# Altium footprint library 6-Connectors-1.PcbLib: 54 footprints (part 1 of 5) (continued)
## AMPHENOL_L717DFB25P1ATN [mm] "Right Angled D-Sub 25 Male Contacts with Metal Bracket and Front Female Screwlock (UNC4-40)" (continued)
3D body "v160-080.stp": height 0.02, standoff -1.65, extent -6.34,-2.07 -4.74,-0.47
3D body "v160-080.stp": height 0.02, standoff -1.65, extent -7.71,0.47 -6.11,2.07
3D body "v160-080.stp": height 0.02, standoff -1.65, extent -9.11,-2.07 -7.51,-0.47
3D body "v160-080.stp": height 0.02, standoff -1.65, extent -10.48,0.47 -8.88,2.07
3D body "v160-080.stp": height 0.02, standoff -1.65, extent -11.88,-2.07 -10.28,-0.47
3D body "v160-080.stp": height 0.02, standoff -1.65, extent -14.65,-2.07 -13.05,-0.47
3D body "v160-080.stp": height 0.02, standoff -1.65, extent -13.25,0.47 -11.65,2.07
3D body "v160-080.stp": height 0.02, standoff -1.65, extent -16.02,0.47 -14.42,2.07
3D body "v160-080.stp": height 0.02, standoff -1.65, extent -17.42,-2.07 -15.82,-0.47
3D body "AMPHENOL_L717DFA25P1ATN.stp": height 13.45, standoff -3.95, extent -26.6,-2.93 26.6,17.47

## AMPHENOL_L717DFC37P1ATN [mm] "Right Angled D-Sub 37 Male Contacts with Metal Bracket and Front Female Screwlock (UNC4-40)"
height 13.4
pads (39):
  round 1.6 hole 0.9: 1(24.93,-1.27) 2(22.16,-1.27) 3(19.39,-1.27) 4(16.62,-1.27) 5(13.85,-1.27) 6(11.08,-1.27) 7(8.31,-1.27) 8(5.54,-1.27) 9(2.77,-1.27) 10(0,-1.27) 11(-2.77,-1.27) 12(-5.54,-1.27) 13(-8.31,-1.27) 14(-11.08,-1.27) 15(-13.85,-1.27) 16(-16.62,-1.27) 17(-19.39,-1.27) 18(-22.16,-1.27) 19(-24.93,-1.27) 20(23.56,1.27) 21(20.79,1.27) 22(18.02,1.27) 23(15.25,1.27) 24(12.48,1.27) 25(9.71,1.27) 26(6.94,1.27) 27(4.17,1.27) 28(1.4,1.27) 29(-1.37,1.27) 30(-4.14,1.27) 31(-6.91,1.27) 32(-9.68,1.27) 33(-12.45,1.27) 34(-15.22,1.27) 35(-17.99,1.27) 36(-20.76,1.27) 37(-23.53,1.27)
  round 5.5 hole 3.2: 38(31.75,0) 39(-31.75,0)
Top Overlay:
  circle w0.2: c31.75,5.2 r0.8
  circle w0.2: c-31.75,5.2 r0.8
  lines w0.2: -34.6,10.67 -34.6,11.57 34.6,11.57 34.6,10.67 ; -34.25,9.67 -34.25,9.17 -29.25,9.17 -29.25,9.67 ; -34.25,11.57 -34.25,16.77 -29.25,16.77 -29.25,11.57 ; -32.907,-2.93 -34.85,-2.93 -34.85,10.67 34.85,10.67 34.85,-2.93 32.907,-2.93 ; -30.593,-2.93 -28.65,-2.93 -28.65,10.67 ; -28.789,9.67 -34.85,9.67 -28.65,9.67 ; -28.65,7.17 28.65,7.17 ; -28.001,11.57 -28.001,17.17 cw(c-27.701,17.17) -27.701,17.47 27.702,17.47 cw(c27.702,17.17) 28.002,17.17 28.002,11.57 ; -26.82,7.17 -26.82,6.17 26.82,6.17 26.82,7.17 ; 28.65,9.67 34.85,9.67 ; 28.65,10.67 28.65,-2.93 30.593,-2.93 ; 29.25,9.67 29.25,9.17 34.25,9.17 34.25,9.67 ; 29.25,11.57 29.25,16.77 34.25,16.77 34.25,11.57
  text "37" at -27.197,0.508 h1.2
  text "19" at -28.21,-2 h1.2
  text "1" at 26.181,-2.032 h1.2
  text "20" at 26.181,0.508 h1.2
Mechanical 8:
  drawing of 164 lines, arcs and shapes, not listed
Mechanical 14:
  circle w0.1: c31.75,0 r1.6
  circle w0.1: c31.75,5.2 r0.8
  circle w0.1: c-31.75,5.2 r0.8
  circle w0.1: c-31.75,0 r1.6
  lines w0.1: -34.6,10.67 -34.6,11.57 34.6,11.57 34.6,10.67 ; -34.25,9.67 -34.25,9.17 -29.25,9.17 -29.25,9.67 ; -34.25,11.57 -34.25,16.77 -29.25,16.77 -29.25,11.57 ; -28.789,9.67 -34.85,9.67 -28.65,9.67 ; -28.65,7.17 28.65,7.17 ; -28.65,10.67 -28.65,-2.93 -34.85,-2.93 -34.85,10.67 34.85,10.67 34.85,-2.93 28.65,-2.93 28.65,10.67 ; -28.001,11.57 -28.001,17.17 cw(c-27.701,17.17) -27.701,17.47 27.702,17.47 cw(c27.702,17.17) 28.002,17.17 28.002,11.57 ; -26.82,7.17 -26.82,6.17 26.82,6.17 26.82,7.17 ; -25.33,6.17 -25.33,-1.27 ccw(c-24.93,-1.27) -24.53,-1.27 -24.53,6.17 ; -23.93,6.17 -23.93,1.27 ccw(c-23.53,1.27) -23.13,1.27 -23.13,6.17 ; -22.56,6.17 -22.56,-1.27 ccw(c-22.16,-1.27) -21.76,-1.27 -21.76,6.17 ; -21.16,6.17 -21.16,1.27 ccw(c-20.76,1.27) -20.36,1.27 -20.36,6.17 ; -19.79,6.17 -19.79,-1.27 ccw(c-19.39,-1.27) -18.99,-1.27 -18.99,6.17 ; -18.39,6.17 -18.39,1.27 ccw(c-17.99,1.27) -17.59,1.27 -17.59,6.17 ; -17.02,6.17 -17.02,-1.27 ccw(c-16.62,-1.27) -16.22,-1.27 -16.22,6.17 ; -15.62,6.17 -15.62,1.27 ccw(c-15.22,1.27) -14.82,1.27 -14.82,6.17 ; -14.25,6.17 -14.25,-1.27 ccw(c-13.85,-1.27) -13.45,-1.27 -13.45,6.17 ; -12.85,6.17 -12.85,1.27 ccw(c-12.45,1.27) -12.05,1.27 -12.05,6.17 ; -11.48,6.17 -11.48,-1.27 ccw(c-11.08,-1.27) -10.68,-1.27 -10.68,6.17 ; -10.08,6.17 -10.08,1.27 ccw(c-9.68,1.27) -9.28,1.27 -9.28,6.17 ; -8.71,6.17 -8.71,-1.27 ccw(c-8.31,-1.27) -7.91,-1.27 -7.91,6.17 ; -7.31,6.17 -7.31,1.27 ccw(c-6.91,1.27) -6.51,1.27 -6.51,6.17 ; -5.94,6.17 -5.94,-1.27 ccw(c-5.54,-1.27) -5.14,-1.27 -5.14,6.17 ; -4.54,6.17 -4.54,1.27 ccw(c-4.14,1.27) -3.74,1.27 -3.74,6.17 ; -3.17,6.17 -3.17,-1.27 ccw(c-2.77,-1.27) -2.37,-1.27 -2.37,6.17 ; -1.77,6.17 -1.77,1.27 ccw(c-1.37,1.27) -0.97,1.27 -0.97,6.17 ; -0.4,6.17 -0.4,-1.27 ccw(c0,-1.27) 0.4,-1.27 0.4,6.17 ; 1,6.17 1,1.27 ccw(c1.4,1.27) 1.8,1.27 1.8,6.17 ; 2.37,6.17 2.37,-1.27 ccw(c2.77,-1.27) 3.17,-1.27 3.17,6.17 ; 3.77,6.17 3.77,1.27 ccw(c4.17,1.27) 4.57,1.27 4.57,6.17 ; 5.14,6.17 5.14,-1.27 ccw(c5.54,-1.27) 5.94,-1.27 5.94,6.17 ; 6.54,6.17 6.54,1.27 ccw(c6.94,1.27) 7.34,1.27 7.34,6.17 ; 7.91,6.17 7.91,-1.27 ccw(c8.31,-1.27) 8.71,-1.27 8.71,6.17 ; 9.31,6.17 9.31,1.27 ccw(c9.71,1.27) 10.11,1.27 10.11,6.17 ; 10.68,6.17 10.68,-1.27 ccw(c11.08,-1.27) 11.48,-1.27 11.48,6.17 ; 12.08,6.17 12.08,1.27 ccw(c12.48,1.27) 12.88,1.27 12.88,6.17 ; 13.45,6.17 13.45,-1.27 ccw(c13.85,-1.27) 14.25,-1.27 14.25,6.17 ; 14.85,6.17 14.85,1.27 ccw(c15.25,1.27) 15.65,1.27 15.65,6.17 ; 16.22,6.17 16.22,-1.27 ccw(c16.62,-1.27) 17.02,-1.27 17.02,6.17 ; 17.62,6.17 17.62,1.27 ccw(c18.02,1.27) 18.42,1.27 18.42,6.17 ; 18.99,6.17 18.99,-1.27 ccw(c19.39,-1.27) 19.79,-1.27 19.79,6.17 ; 20.39,6.17 20.39,1.27 ccw(c20.79,1.27) 21.19,1.27 21.19,6.17 ; 21.76,6.17 21.76,-1.27 ccw(c22.16,-1.27) 22.56,-1.27 22.56,6.17 ; 23.16,6.17 23.16,1.27 ccw(c23.56,1.27) 23.96,1.27 23.96,6.17 ; 24.53,6.17 24.53,-1.27 ccw(c24.93,-1.27) 25.33,-1.27 25.33,6.17 ; 28.65,9.67 34.85,9.67 ; 29.25,9.67 29.25,9.17 34.25,9.17 34.25,9.67 ; 29.25,11.57 29.25,16.77 34.25,16.77 34.25,11.57
3D body "AMPHENOL_L717DFC37P1ATN.stp": height 13.45, standoff -3.95, extent -34.85,-2.93 34.85,17.47
3D body "v160-080.stp": height 0.02, standoff -1.65, extent -25.73,-2.07 -24.13,-0.47
3D body "v160-080.stp": height 0.02, standoff -1.65, extent -24.33,0.47 -22.73,2.07
3D body "v160-080.stp": height 0.02, standoff -1.65, extent -22.96,-2.07 -21.36,-0.47
3D body "v160-080.stp": height 0.02, standoff -1.65, extent -21.56,0.47 -19.96,2.07
3D body "v160-080.stp": height 0.02, standoff -1.65, extent -20.19,-2.07 -18.59,-0.47
3D body "v160-080.stp": height 0.02, standoff -1.65, extent -18.79,0.47 -17.19,2.07
3D body "v160-080.stp": height 0.02, standoff -1.65, extent -16.02,0.47 -14.42,2.07
3D body "v160-080.stp": height 0.02, standoff -1.65, extent -17.42,-2.07 -15.82,-0.47
3D body "v160-080.stp": height 0.02, standoff -1.65, extent -14.65,-2.07 -13.05,-0.47
3D body "v160-080.stp": height 0.02, standoff -1.65, extent -13.25,0.47 -11.65,2.07
3D body "v160-080.stp": height 0.02, standoff -1.65, extent -10.48,0.47 -8.88,2.07
3D body "v160-080.stp": height 0.02, standoff -1.65, extent -11.88,-2.07 -10.28,-0.47
3D body "v160-080.stp": height 0.02, standoff -1.65, extent -9.11,-2.07 -7.51,-0.47
3D body "v160-080.stp": height 0.02, standoff -1.65, extent -6.34,-2.07 -4.74,-0.47
3D body "v160-080.stp": height 0.02, standoff -1.65, extent -7.658,0.47 -6.058,2.07
3D body "v160-080.stp": height 0.02, standoff -1.65, extent -4.94,0.47 -3.34,2.07
3D body "v160-080.stp": height 0.02, standoff -1.65, extent -3.57,-2.07 -1.97,-0.47
3D body "v160-080.stp": height 0.02, standoff -1.65, extent -0.8,-2.07 0.8,-0.47
3D body "v160-080.stp": height 0.02, standoff -1.65, extent -2.17,0.47 -0.57,2.07
3D body "v160-080.stp": height 0.02, standoff -1.65, extent 0.6,0.47 2.2,2.07
3D body "v160-080.stp": height 0.02, standoff -1.65, extent 1.97,-2.07 3.57,-0.47
3D body "v160-080.stp": height 0.02, standoff -1.65, extent 4.74,-2.07 6.34,-0.47
3D body "v160-080.stp": height 0.02, standoff -1.65, extent 3.37,0.47 4.97,2.07
3D body "v160-080.stp": height 0.02, standoff -1.65, extent 6.14,0.47 7.74,2.07
3D body "v160-080.stp": height 0.02, standoff -1.65, extent 7.51,-2.07 9.11,-0.47
3D body "v160-080.stp": height 0.02, standoff -1.65, extent 8.91,0.47 10.51,2.07
3D body "v160-080.stp": height 0.02, standoff -1.65, extent 10.28,-2.07 11.88,-0.47
3D body "v160-080.stp": height 0.02, standoff -1.65, extent 11.646,0.47 13.246,2.07
3D body "v160-080.stp": height 0.02, standoff -1.65, extent 13.05,-2.07 14.65,-0.47
3D body "v160-080.stp": height 0.02, standoff -1.65, extent 14.45,0.47 16.05,2.07
3D body "v160-080.stp": height 0.02, standoff -1.65, extent 15.82,-2.07 17.42,-0.47
3D body "v160-080.stp": height 0.02, standoff -1.65, extent 17.22,0.47 18.82,2.07
3D body "v160-080.stp": height 0.02, standoff -1.65, extent 18.59,-2.07 20.19,-0.47
3D body "v160-080.stp": height 0.02, standoff -1.65, extent 21.36,-2.07 22.96,-0.47
3D body "v160-080.stp": height 0.02, standoff -1.65, extent 19.99,0.47 21.59,2.07
3D body "v160-080.stp": height 0.02, standoff -1.65, extent 22.76,0.47 24.36,2.07
3D body "v160-080.stp": height 0.02, standoff -1.65, extent 24.13,-2.07 25.73,-0.47

## AMPHENOL_L717DFE09P1ATN [mm] "Right Angled D-Sub 9 Male Contacts with Metal Bracket and Front Female Screwlock (UNC4-40)"
height 13.4
pads (11):
  round 1.6 hole 0.9: 1(5.48,-1.27) 2(2.74,-1.27) 3(0,-1.27) 4(-2.74,-1.27) 5(-5.48,-1.27) 6(4.11,1.27) 7(1.37,1.27) 8(-1.37,1.27) 9(-4.11,1.27)
  round 5.5 hole 3.2: 10(-12.495,0) 11(12.495,0)
Top Overlay:
  circle w0.2: c-12.5,5.2 r0.8
  circle w0.2: c12.5,5.2 r0.8
  lines w0.2: -15.35,10.67 -15.35,11.57 15.35,11.57 15.35,10.67 ; -15,9.67 -15,9.17 -10,9.17 -10,9.67 ; -15,11.57 -15,16.77 -10,16.77 -10,11.57 ; -14,-2.93 -15.6,-2.93 -15.6,10.67 15.6,10.67 15.6,-2.93 14,-2.93 ; -11,-2.93 -9.4,-2.93 -9.4,10.67 ; -9.539,9.67 -15.6,9.67 -9.4,9.67 ; -9.4,7.17 9.4,7.17 ; -8.142,11.57 -8.142,17.37 cw(c-7.842,17.37) -7.842,17.67 7.861,17.67 cw(c7.861,17.37) 8.161,17.37 8.161,11.57 ; -7.57,7.17 -7.57,6.17 7.57,6.17 7.57,7.17 ; 9.4,9.67 15.6,9.67 ; 9.4,10.67 9.4,-2.93 11,-2.93 ; 10,9.67 10,9.17 15,9.17 15,9.67 ; 10,11.57 10,16.77 15,16.77 15,11.57
  text "9" at -7.747,0.508 h1.5
  text "1" at 6.731,-2.032 h1.5
  text "5" at -7.747,-2.032 h1.5
  text "6" at 6.604,0.635 h1.5
Mechanical 8:
  lines w0.1: -13.5,0 -12.5,0 ; -12.5,-1 -12.5,0 ; -12.5,1 -12.5,0 ; -11.5,0 -12.5,0 ; -6.48,-1.27 -5.48,-1.27 ; -5.48,-2.27 -5.48,-1.27 ; -5.48,-0.27 -5.48,-1.27 ; -5.11,1.27 -4.11,1.27 ; -4.48,-1.27 -5.48,-1.27 ; -4.11,0.27 -4.11,1.27 ; -4.11,2.27 -4.11,1.27 ; -3.74,-1.27 -2.74,-1.27 ; -3.11,1.27 -4.11,1.27 ; -2.74,-2.27 -2.74,-1.27 ; -2.74,-0.27 -2.74,-1.27 ; -2.37,1.27 -1.37,1.27 ; -1.74,-1.27 -2.74,-1.27 ; -1.37,0.27 -1.37,1.27 ; -1.37,2.27 -1.37,1.27 ; -1,-1.27 0,-1.27 ; -1,0 0,0 ; -0.37,1.27 -1.37,1.27 ; 0,-2.27 0,-1.27 ; 0,-1 0,0 ; 0,-0.27 0,-1.27 ; 0,1 0,0 ; 0.37,1.27 1.37,1.27 ; 1,-1.27 0,-1.27 ; 1,0 0,0 ; 1.37,0.27 1.37,1.27 ; 1.37,2.27 1.37,1.27 ; 1.74,-1.27 2.74,-1.27 ; 2.37,1.27 1.37,1.27 ; 2.74,-2.27 2.74,-1.27 ; 2.74,-0.27 2.74,-1.27 ; 3.11,1.27 4.11,1.27 ; 3.74,-1.27 2.74,-1.27 ; 4.11,0.27 4.11,1.27 ; 4.11,2.27 4.11,1.27 ; 4.48,-1.27 5.48,-1.27 ; 5.11,1.27 4.11,1.27 ; 5.48,-2.27 5.48,-1.27 ; 5.48,-0.27 5.48,-1.27 ; 6.48,-1.27 5.48,-1.27 ; 11.5,0 12.5,0 ; 12.5,-1 12.5,0 ; 12.5,1 12.5,0 ; 13.5,0 12.5,0
Mechanical 14:
  circle w0.1: c-12.5,0 r1.6
  circle w0.1: c-12.5,5.2 r0.8
  circle w0.1: c12.5,5.2 r0.8
  circle w0.1: c12.5,0 r1.6
  lines w0.1: -15.35,10.67 -15.35,11.57 15.35,11.57 15.35,10.67 ; -15,9.67 -15,9.17 -10,9.17 -10,9.67 ; -15,11.57 -15,16.77 -10,16.77 -10,11.57 ; -9.539,9.67 -15.6,9.67 -9.4,9.67 ; -9.4,7.17 9.4,7.17 ; -9.4,10.67 -9.4,-2.93 -15.6,-2.93 -15.6,10.67 15.6,10.67 15.6,-2.93 9.4,-2.93 9.4,10.67 ; -8.142,11.57 -8.142,17.37 cw(c-7.842,17.37) -7.842,17.67 7.861,17.67 cw(c7.861,17.37) 8.161,17.37 8.161,11.57 ; -7.57,7.17 -7.57,6.17 7.57,6.17 7.57,7.17 ; -5.88,6.17 -5.88,-1.27 ccw(c-5.48,-1.27) -5.08,-1.27 -5.08,6.17 ; -4.51,6.17 -4.51,1.27 ccw(c-4.11,1.27) -3.71,1.27 -3.71,6.17 ; -3.14,6.17 -3.14,-1.27 ccw(c-2.74,-1.27) -2.34,-1.27 -2.34,6.17 ; -1.77,6.17 -1.77,1.27 ccw(c-1.37,1.27) -0.97,1.27 -0.97,6.17 ; -0.4,6.17 -0.4,-1.27 ccw(c0,-1.27) 0.4,-1.27 0.4,6.17 ; 0.97,6.17 0.97,1.27 ccw(c1.37,1.27) 1.77,1.27 1.77,6.17 ; 2.34,6.17 2.34,-1.27 ccw(c2.74,-1.27) 3.14,-1.27 3.14,6.17 ; 3.71,6.17 3.71,1.27 ccw(c4.11,1.27) 4.51,1.27 4.51,6.17 ; 5.08,6.17 5.08,-1.27 ccw(c5.48,-1.27) 5.88,-1.27 5.88,6.17 ; 9.4,9.67 15.6,9.67 ; 10,9.67 10,9.17 15,9.17 15,9.67 ; 10,11.57 10,16.77 15,16.77 15,11.57
3D body "v160-080.stp": height 0.02, standoff -1.65, extent 3.31,0.47 4.91,2.07
3D body "v160-080.stp": height 0.02, standoff -1.65, extent 4.68,-2.07 6.28,-0.47
3D body "v160-080.stp": height 0.02, standoff -1.65, extent 1.94,-2.07 3.54,-0.47
3D body "v160-080.stp": height 0.02, standoff -1.65, extent 0.57,0.47 2.17,2.07
3D body "v160-080.stp": height 0.02, standoff -1.65, extent -2.17,0.47 -0.57,2.07
3D body "v160-080.stp": height 0.02, standoff -1.65, extent -0.8,-2.07 0.8,-0.47
3D body "v160-080.stp": height 0.02, standoff -1.65, extent -3.54,-2.07 -1.94,-0.47
3D body "v160-080.stp": height 0.02, standoff -1.65, extent -4.91,0.47 -3.31,2.07
3D body "v160-080.stp": height 0.02, standoff -1.65, extent -6.28,-2.07 -4.68,-0.47
3D body "AMPHENOL_L717DFE09P1ATN.stp": height 13.45, standoff -3.95, extent -15.6,-2.93 15.6,17.67

## AMPHENOL_L717DFE09S1ATN [mm] "Right Angled D-Sub 9 Female Contacts with Metal Bracket and Front Female Screwlock (UNC4-40)"
height 13.4
pads (11):
  round 1.6 hole 0.9: 1(-5.48,-1.27) 2(-2.74,-1.27) 3(0,-1.27) 4(2.74,-1.27) 5(5.48,-1.27) 6(-4.11,1.27) 7(-1.37,1.27) 8(1.37,1.27) 9(4.11,1.27)
  round 5.5 hole 3.2: 10(-12.495,0) 11(12.495,0)
Top Overlay:
  circle w0.2: c-12.5,5.2 r0.8
  circle w0.2: c12.5,5.2 r0.8
  lines w0.2: -15.35,10.67 -15.35,11.57 15.35,11.57 15.35,10.67 ; -15,9.67 -15,9.17 -10,9.17 -10,9.67 ; -15,11.57 -15,16.77 -10,16.77 -10,11.57 ; -14,-2.93 -15.6,-2.93 -15.6,10.67 15.6,10.67 15.6,-2.93 14,-2.93 ; -11,-2.93 -9.4,-2.93 -9.4,10.67 ; -9.539,9.67 -15.6,9.67 -9.4,9.67 ; -9.4,7.17 9.4,7.17 ; -8.142,11.57 -8.142,17.37 cw(c-7.842,17.37) -7.842,17.67 7.861,17.67 cw(c7.861,17.37) 8.161,17.37 8.161,11.57 ; -7.57,7.17 -7.57,6.17 7.57,6.17 7.57,7.17 ; 9.4,9.67 15.6,9.67 ; 9.4,10.67 9.4,-2.93 11,-2.93 ; 10,9.67 10,9.17 15,9.17 15,9.67 ; 10,11.57 10,16.77 15,16.77 15,11.57
  text "6" at -7.366,0.508 h1.5
  text "5" at 6.731,-2.032 h1.5
  text "1" at -7.239,-2.032 h1.5
  text "9" at 6.731,0.508 h1.5
Mechanical 8:
  lines w0.1: -13.5,0 -12.5,0 ; -12.5,-1 -12.5,0 ; -12.5,1 -12.5,0 ; -11.5,0 -12.5,0 ; -6.48,-1.27 -5.48,-1.27 ; -5.48,-2.27 -5.48,-1.27 ; -5.48,-0.27 -5.48,-1.27 ; -5.11,1.27 -4.11,1.27 ; -4.48,-1.27 -5.48,-1.27 ; -4.11,0.27 -4.11,1.27 ; -4.11,2.27 -4.11,1.27 ; -3.74,-1.27 -2.74,-1.27 ; -3.11,1.27 -4.11,1.27 ; -2.74,-2.27 -2.74,-1.27 ; -2.74,-0.27 -2.74,-1.27 ; -2.37,1.27 -1.37,1.27 ; -1.74,-1.27 -2.74,-1.27 ; -1.37,0.27 -1.37,1.27 ; -1.37,2.27 -1.37,1.27 ; -1,-1.27 0,-1.27 ; -1,0 0,0 ; -0.37,1.27 -1.37,1.27 ; 0,-2.27 0,-1.27 ; 0,-1 0,0 ; 0,-0.27 0,-1.27 ; 0,1 0,0 ; 0.37,1.27 1.37,1.27 ; 1,-1.27 0,-1.27 ; 1,0 0,0 ; 1.37,0.27 1.37,1.27 ; 1.37,2.27 1.37,1.27 ; 1.74,-1.27 2.74,-1.27 ; 2.37,1.27 1.37,1.27 ; 2.74,-2.27 2.74,-1.27 ; 2.74,-0.27 2.74,-1.27 ; 3.11,1.27 4.11,1.27 ; 3.74,-1.27 2.74,-1.27 ; 4.11,0.27 4.11,1.27 ; 4.11,2.27 4.11,1.27 ; 4.48,-1.27 5.48,-1.27 ; 5.11,1.27 4.11,1.27 ; 5.48,-2.27 5.48,-1.27 ; 5.48,-0.27 5.48,-1.27 ; 6.48,-1.27 5.48,-1.27 ; 11.5,0 12.5,0 ; 12.5,-1 12.5,0 ; 12.5,1 12.5,0 ; 13.5,0 12.5,0
Mechanical 14:
  circle w0.1: c-12.5,0 r1.6
  circle w0.1: c-12.5,5.2 r0.8
  circle w0.1: c12.5,5.2 r0.8
  circle w0.1: c12.5,0 r1.6
  lines w0.1: -15.35,10.67 -15.35,11.57 15.35,11.57 15.35,10.67 ; -15,9.67 -15,9.17 -10,9.17 -10,9.67 ; -15,11.57 -15,16.77 -10,16.77 -10,11.57 ; -9.539,9.67 -15.6,9.67 -9.4,9.67 ; -9.4,7.17 9.4,7.17 ; -9.4,10.67 -9.4,-2.93 -15.6,-2.93 -15.6,10.67 15.6,10.67 15.6,-2.93 9.4,-2.93 9.4,10.67 ; -8.142,11.57 -8.142,17.37 cw(c-7.842,17.37) -7.842,17.67 7.861,17.67 cw(c7.861,17.37) 8.161,17.37 8.161,11.57 ; -7.57,7.17 -7.57,6.17 7.57,6.17 7.57,7.17 ; -5.88,6.17 -5.88,-1.27 ccw(c-5.48,-1.27) -5.08,-1.27 -5.08,6.17 ; -4.51,6.17 -4.51,1.27 ccw(c-4.11,1.27) -3.71,1.27 -3.71,6.17 ; -3.14,6.17 -3.14,-1.27 ccw(c-2.74,-1.27) -2.34,-1.27 -2.34,6.17 ; -1.77,6.17 -1.77,1.27 ccw(c-1.37,1.27) -0.97,1.27 -0.97,6.17 ; -0.4,6.17 -0.4,-1.27 ccw(c0,-1.27) 0.4,-1.27 0.4,6.17 ; 0.97,6.17 0.97,1.27 ccw(c1.37,1.27) 1.77,1.27 1.77,6.17 ; 2.34,6.17 2.34,-1.27 ccw(c2.74,-1.27) 3.14,-1.27 3.14,6.17 ; 3.71,6.17 3.71,1.27 ccw(c4.11,1.27) 4.51,1.27 4.51,6.17 ; 5.08,6.17 5.08,-1.27 ccw(c5.48,-1.27) 5.88,-1.27 5.88,6.17 ; 9.4,9.67 15.6,9.67 ; 10,9.67 10,9.17 15,9.17 15,9.67 ; 10,11.57 10,16.77 15,16.77 15,11.57
3D body "v160-080.stp": height 0.02, standoff -1.65, extent 3.31,0.47 4.91,2.07
3D body "v160-080.stp": height 0.02, standoff -1.65, extent 4.68,-2.07 6.28,-0.47
3D body "v160-080.stp": height 0.02, standoff -1.65, extent 1.94,-2.07 3.54,-0.47
3D body "v160-080.stp": height 0.02, standoff -1.65, extent 0.57,0.47 2.17,2.07
3D body "v160-080.stp": height 0.02, standoff -1.65, extent -0.8,-2.07 0.8,-0.47
3D body "v160-080.stp": height 0.02, standoff -1.65, extent -2.17,0.47 -0.57,2.07
3D body "v160-080.stp": height 0.02, standoff -1.65, extent -3.54,-2.07 -1.94,-0.47
3D body "v160-080.stp": height 0.02, standoff -1.65, extent -4.91,0.47 -3.31,2.07
3D body "v160-080.stp": height 0.02, standoff -1.65, extent -6.28,-2.07 -4.68,-0.47
3D body "AMPHENOL_L717DFE09S1ATN.stp": height 13.45, standoff -3.95, extent -15.6,-2.93 15.6,17.67

## BULGIN_PX0580-PC-COL [mm] "10A 250Vac PC Flange Rear Mount Inlet IEC Connector"
height 32.1
pads (5):
  round 2.4 hole 1.7: 1(9.14,0) 2(0,0) 3(-9.14,0)
  round 5.5 hole 3.4: 4(-20,9.65) 4(20,9.65)
Top Overlay:
  lines w0.2: -24.9,15.95 24.9,15.95 ; -14.785,18.35 -14.785,21.35 14.785,21.35 14.785,18.35 ; -13.3,0.45 -10.727,0.45 ; -13.3,3.35 -22.4,3.35 cw(c-22.4,5.85) -24.9,5.85 -24.9,18.35 24.9,18.35 24.9,5.85 cw(c22.4,5.85) 22.4,3.35 13.3,3.35 ; -13.3,15.95 -13.3,-3.55 13.3,-3.55 13.3,15.95 ; -7.553,0.45 -1.587,0.45 ; -7.539,0.45 -7.539,15.95 ; -1,-2.257 1,-2.257 ; -0.7,-2.657 0.7,-2.657 ; -0.4,-3.057 0.3,-3.057 ; 0,-2.257 0,-1.657 ; 1.587,0.45 7.553,0.45 ; 7.539,0.45 7.539,15.95 ; 10.727,0.45 13.3,0.45
  text "N" at -9.602,-3.075 h1.5
  text "L" at 8.843,-3.075 h1.5
Mechanical 8:
  lines w0.1: -21,9.65 -20,9.65 ; -20,8.65 -20,9.65 ; -20,10.65 -20,9.65 ; -19,9.65 -20,9.65 ; -10.14,0 -9.14,0 ; -9.14,-1 -9.14,0 ; -9.14,1 -9.14,0 ; -8.14,0 -9.14,0 ; -1,0 0,0 ; 0,-1 0,0 ; 0,1 0,0 ; 1,0 0,0 ; 8.14,0 9.14,0 ; 9.14,-1 9.14,0 ; 9.14,1 9.14,0 ; 10.14,0 9.14,0 ; 19,9.65 20,9.65 ; 20,8.65 20,9.65 ; 20,10.65 20,9.65 ; 21,9.65 20,9.65
Mechanical 14:
  circle w0.1: c20,9.65 r1.7
  circle w0.1: c-20,9.65 r1.7
  lines w0.1: -24.9,15.95 24.9,15.95 ; -14.785,18.35 -14.785,21.35 14.785,21.35 14.785,18.35 ; -13.3,0.45 13.3,0.45 ; -13.3,3.35 -22.4,3.35 cw(c-22.4,5.85) -24.9,5.85 -24.9,18.35 24.9,18.35 24.9,5.85 cw(c22.4,5.85) 22.4,3.35 13.3,3.35 ; -13.3,15.95 -13.3,-3.55 13.3,-3.55 13.3,15.95 ; -7.539,0.45 -7.539,15.95 ; -1,-2.257 1,-2.257 ; -0.7,-2.657 0.7,-2.657 ; -0.4,-3.057 0.3,-3.057 ; 0,-2.257 0,-1.657 ; 7.539,0.45 7.539,15.95
  text "N" at -9.602,-3.075 h1.5
  text "L" at 8.843,-3.075 h1.5
3D body "v240-170.stp": height 0.02, standoff -1.65, extent 7.94,-1.2 10.34,1.2
3D body "v240-170.stp": height 0.02, standoff -1.65, extent -1.2,-1.2 1.2,1.2
3D body "v240-170.stp": height 0.02, standoff -1.65, extent -10.34,-1.2 -7.94,1.2
3D body "BULGIN_PX0580-PC-COL.stp": height 27.8, standoff -3.6, extent -24.9,-3.55 24.9,21.35

## BULGIN_PX0675-PC-COL [mm] "10A 250Vac PC Flange Rear Mount Outlet IEC Connector"
height 30.4
pads (5):
  round 2.4 hole 1.7: 1(-7,0) 2(0,0) 3(7,0)
  round 5.5 hole 3.4: 4(-20,15.1) 4(20,15.1)
Top Overlay:
  lines w0.2: -25.05,21.5 25.05,21.5 ; -16.975,23.8 -16.95,23.825 -16.95,27.1 16.95,27.1 16.95,23.8 ; -15.9,8.7 -21.55,8.7 cw(c-21.55,12.2) -25.05,12.2 -25.05,23.8 25.05,23.8 25.05,12.2 cw(c21.55,12.2) 21.55,8.7 15.9,8.7 ; -15.9,21.5 -15.9,6.9 15.9,6.9 15.9,21.5 ; -14.775,6.9 -14.775,5.77 -13.65,5.77 ; -13.65,6.9 -13.65,0.9 -8.786,0.9 ; -5.214,0.9 -4.4,0.9 ; -1.67,-1.1 -4.4,-1.1 -4.4,0.9 ; -0.9,3 1.1,3 ; -0.6,2.6 0.8,2.6 ; -0.4,-1.96 -0.4,-11.1 0.4,-11.1 0.4,-1.96 ; -0.3,2.2 0.4,2.2 ; 0.1,3 0.1,3.6 ; 1.67,-1.1 4.4,-1.1 4.4,0.9 ; 5.214,0.9 4.4,0.9 ; 8.786,0.9 13.65,0.9 13.65,6.9 ; 9,6.9 9,21.5 ; 13.65,5.77 14.775,5.77 14.775,6.9 ; -4.4,0.9 -2.5,0.9 -2.5,3.5 -3.9,3.5 -3.9,6.1 3.9,6.1 3.9,3.5 2.5,3.5 2.5,0.9 4.4,0.9 ; -9,6.9 -9,21.5 -9,6.9
  text "N" at 6.53,2.055 h1.5
  text "L" at -7.47,2.055 h1.5
Mechanical 8:
  lines w0.1: -21,15.1 -20,15.1 ; -20,14.1 -20,15.1 ; -20,16.1 -20,15.1 ; -19,15.1 -20,15.1 ; -8,0 -7,0 ; -7,-1 -7,0 ; -7,1 -7,0 ; -6,0 -7,0 ; -1,0 0,0 ; 0,-1 0,0 ; 0,1 0,0 ; 1,0 0,0 ; 6,0 7,0 ; 7,-1 7,0 ; 7,1 7,0 ; 8,0 7,0 ; 19,15.1 20,15.1 ; 20,14.1 20,15.1 ; 20,16.1 20,15.1 ; 21,15.1 20,15.1
Mechanical 14:
  circle w0.1: c-20,15.1 r1.7
  circle w0.1: c20,15.1 r1.7
  lines w0.1: -25.05,21.5 25.05,21.5 ; -16.95,23.8 -16.95,27.1 16.95,27.1 16.95,23.8 ; -15.9,8.7 -21.55,8.7 cw(c-21.55,12.2) -25.05,12.2 -25.05,23.8 25.05,23.8 25.05,12.2 cw(c21.55,12.2) 21.55,8.7 15.9,8.7 ; -15.9,21.5 -15.9,6.9 15.9,6.9 15.9,21.5 ; -14.775,6.9 -14.775,5.77 -13.65,5.77 ; -13.65,6.9 -13.65,0.9 -8.5,0.9 -8.5,-0.4 -5.7,-0.4 -5.7,0.9 -4.4,0.9 ; -8.5,0.4 -5.7,0.4 ; -0.9,3 1.1,3 ; -0.6,2.6 0.8,2.6 ; -0.4,-0.4 -0.4,-11.1 0.4,-11.1 0.4,-0.4 ; -0.3,2.2 0.4,2.2 ; 0.1,3 0.1,3.6 ; 5.7,0.4 8.5,0.4 ; 9,6.9 9,21.5 ; 13.65,5.77 14.775,5.77 14.775,6.9 ; 13.65,6.9 13.65,0.9 8.5,0.9 8.5,-0.373 5.7,-0.373 5.7,0.9 4.4,0.9 ; -4.4,0.9 -4.4,-1.1 -1.6,-1.1 -1.6,0.9 1.6,0.9 1.6,-1.1 4.4,-1.1 4.4,0.9 ; -4.4,0.9 -2.5,0.9 -2.5,3.5 -3.9,3.5 -3.9,6.1 3.9,6.1 3.9,3.5 2.5,3.5 2.5,0.9 4.4,0.9 ; -9,6.9 -9,21.5 -9,6.9 ; -1.4,-0.4 -1.4,0.4 1.4,0.4 1.4,-0.4 -1.4,-0.4
  text "N" at 6.53,2.055 h1.5
  text "L" at -7.47,2.055 h1.5
3D body "v240-170.stp": height 0.02, standoff -1.65, extent 5.8,-1.2 8.2,1.2
3D body "v240-170.stp": height 0.02, standoff -1.65, extent -1.2,-1.2 1.2,1.2
3D body "v240-170.stp": height 0.02, standoff -1.65, extent -8.2,-1.2 -5.8,1.2
3D body "BULGIN_PX0675-PC-COL.stp": height 30.4, standoff -3.6, extent -25.05,-11.2 25.05,27.1

## CE [mm]
Top Overlay:
  lines w0.6: 0,-2.413 cw(c0,0) 0,2.413 ; 2.53,0 4.6,0 ; 4.826,-2.438 cw(c4.826,-0.025) 4.826,2.388
3D body "ce.stp": height 0.02, standoff 0, extent -2.725,-2.725 4.82,2.725

## FCI_D09P24A4GV00LF [mm] "Straight D-SUB 9 Male Contacts for PCB  with Harpoons and Female Screwlock (UNC4-40) and Elec. Continuity"
height 12.25
pads (11):
  round 1.5 hole 0.9: 1(-5.48,1.42) 2(-2.74,1.42) 3(0,1.42) 4(2.74,1.42) 5(5.48,1.42) 6(-4.11,-1.42) 7(-1.37,-1.42) 8(1.37,-1.42) 9(4.11,-1.42)
  round 3.8 hole 3.2: 10(-12.495,0) 11(12.495,0)
Top Overlay:
  circle w0.5: c-5.48,7.42 r0.25
  lines w0.2: -15.595,-4.75 ccw(c-13.995,-4.75) -13.995,-6.35 13.995,-6.35 ccw(c13.995,-4.75) 15.595,-4.75 15.595,4.75 ccw(c13.995,4.75) 13.995,6.35 -13.995,6.35 ccw(c-13.995,4.75) -15.595,4.75 -15.595,-4.75 ; -8.928,0.978 cw(c-5.855,1.52) -5.855,4.64 5.955,4.64 cw(c5.955,1.52) 9.028,0.978 8.469,-2.192 cw(c5.396,-1.65) 5.396,-4.77 -5.296,-4.77 cw(c-5.296,-1.65) -8.369,-2.192 -8.928,0.978
  text "6" at -6.46,-2.17 h1.2
  text "5" at 6.93,0.695 h1.2
  text "1" at -7.505,0.67 h1.2
  text "9" at 5.535,-2.17 h1.2
Mechanical 8:
  lines w0.2: -1,0 0,0 0,-1
Mechanical 14:
  circle w0.1: c12.495,0 r2.25
  circle w0.1: c-12.495,0 r2.25
  lines w0.1: -15.595,-4.75 ccw(c-13.995,-4.75) -13.995,-6.35 13.995,-6.35 ccw(c13.995,-4.75) 15.595,-4.75 15.595,4.75 ccw(c13.995,4.75) 13.995,6.35 -13.995,6.35 ccw(c-13.995,4.75) -15.595,4.75 -15.595,-4.75 ; -8.928,0.978 cw(c-5.855,1.52) -5.855,4.64 5.955,4.64 cw(c5.955,1.52) 9.028,0.978 8.469,-2.192 cw(c5.396,-1.65) 5.396,-4.77 -5.296,-4.77 cw(c-5.296,-1.65) -8.369,-2.192 -8.928,0.978 ; -8.435,1.065 cw(c-5.855,1.52) -5.855,4.14 5.955,4.14 cw(c5.955,1.52) 8.535,1.065 7.976,-2.105 cw(c5.396,-1.65) 5.396,-4.27 -5.296,-4.27 cw(c-5.296,-1.65) -7.876,-2.105 -8.435,1.065
  text "9" at 5.535,-2.17 h1.2
  text "1" at -7.505,0.67 h1.2
  text "5" at 6.93,0.695 h1.2
  text "6" at -6.46,-2.17 h1.2
  text "9 D-Sub Male" at -6.053,4.872 h1.2
3D body "FCI_D09P24A4GV00LF.stp": height 12, standoff -3, extent -15.495,-6.275 15.495,6.275

## FCI_D09S24A4GV00LF [mm] "Straight D-SUB 9 Female Contacts for PCB  with Harpoons and Female Screwlock (UNC4-40) and Elec. Continuity"
height 12.39
pads (11):
  round 1.5 hole 0.9: 1(5.48,1.42) 2(2.74,1.42) 3(0,1.42) 4(-2.74,1.42) 5(-5.48,1.42) 6(4.11,-1.42) 7(1.37,-1.42) 8(-1.37,-1.42) 9(-4.11,-1.42)
  round 3.8 hole 3.2: 10(-12.495,0) 11(12.495,0)
Top Overlay:
  circle w0.5: c5.48,7.42 r0.25
  lines w0.2: -15.595,-4.75 ccw(c-13.995,-4.75) -13.995,-6.35 13.995,-6.35 ccw(c13.995,-4.75) 15.595,-4.75 15.595,4.75 ccw(c13.995,4.75) 13.995,6.35 -13.995,6.35 ccw(c-13.995,4.75) -15.595,4.75 -15.595,-4.75 ; -8.167,1.011 cw(c-5.705,1.445) -5.705,3.945 5.705,3.945 cw(c5.705,1.445) 8.167,1.011 7.657,-1.879 cw(c5.195,-1.445) 5.195,-3.945 -5.195,-3.945 cw(c-5.195,-1.445) -7.657,-1.879 -8.167,1.011
  text "1" at 6.855,0.82 h1.2
  text "5" at -7.48,0.895 h1.2
  text "6" at 5.585,-2.045 h1.2
  text "9" at -6.41,-2.045 h1.2
Mechanical 8:
  lines w0.2: -1,0 0,0 0,-1
Mechanical 14:
  circle w0.1: c12.495,0 r2.25
  circle w0.1: c-12.495,0 r2.25
  lines w0.1: -15.595,-4.75 ccw(c-13.995,-4.75) -13.995,-6.35 13.995,-6.35 ccw(c13.995,-4.75) 15.595,-4.75 15.595,4.75 ccw(c13.995,4.75) 13.995,6.35 -13.995,6.35 ccw(c-13.995,4.75) -15.595,4.75 -15.595,-4.75 ; -8.167,1.011 cw(c-5.705,1.445) -5.705,3.945 5.705,3.945 cw(c5.705,1.445) 8.167,1.011 7.657,-1.879 cw(c5.195,-1.445) 5.195,-3.945 -5.195,-3.945 cw(c-5.195,-1.445) -7.657,-1.879 -8.167,1.011 ; -7.291,1.167 cw(c-5.715,1.445) -5.715,3.045 5.715,3.045 cw(c5.715,1.445) 7.291,1.167 6.781,-1.723 cw(c5.205,-1.445) 5.205,-3.045 -5.205,-3.045 cw(c-5.205,-1.445) -6.781,-1.723 -7.291,1.167
  text "9 D-Sub Female" at -6.178,4.472 h1.2
  text "9" at -9.5,-2.025 h1.2
  text "6" at 8.525,-2.05 h1.2
  text "5" at -9.525,1 h1.2
  text "1" at 8.85,1 h1.2
3D body "FCI_D09S24A4GV00LF.stp": height 12.1, standoff -3, extent -15.495,-6.653 15.495,6.21